# Altium footprint library lib_datalogger.PcbLib: 866 footprints (part 28 of 55)
Each footprint in its own frame and in the unit in brackets; x right, y up, seen from the top. Pads: shape width x height; smd on the part's side, far side on the other; paste and mask are expansions set on the pad; w line width, h text height; cw(c..) or ccw(c..) is an arc to the next point about the centre after c.
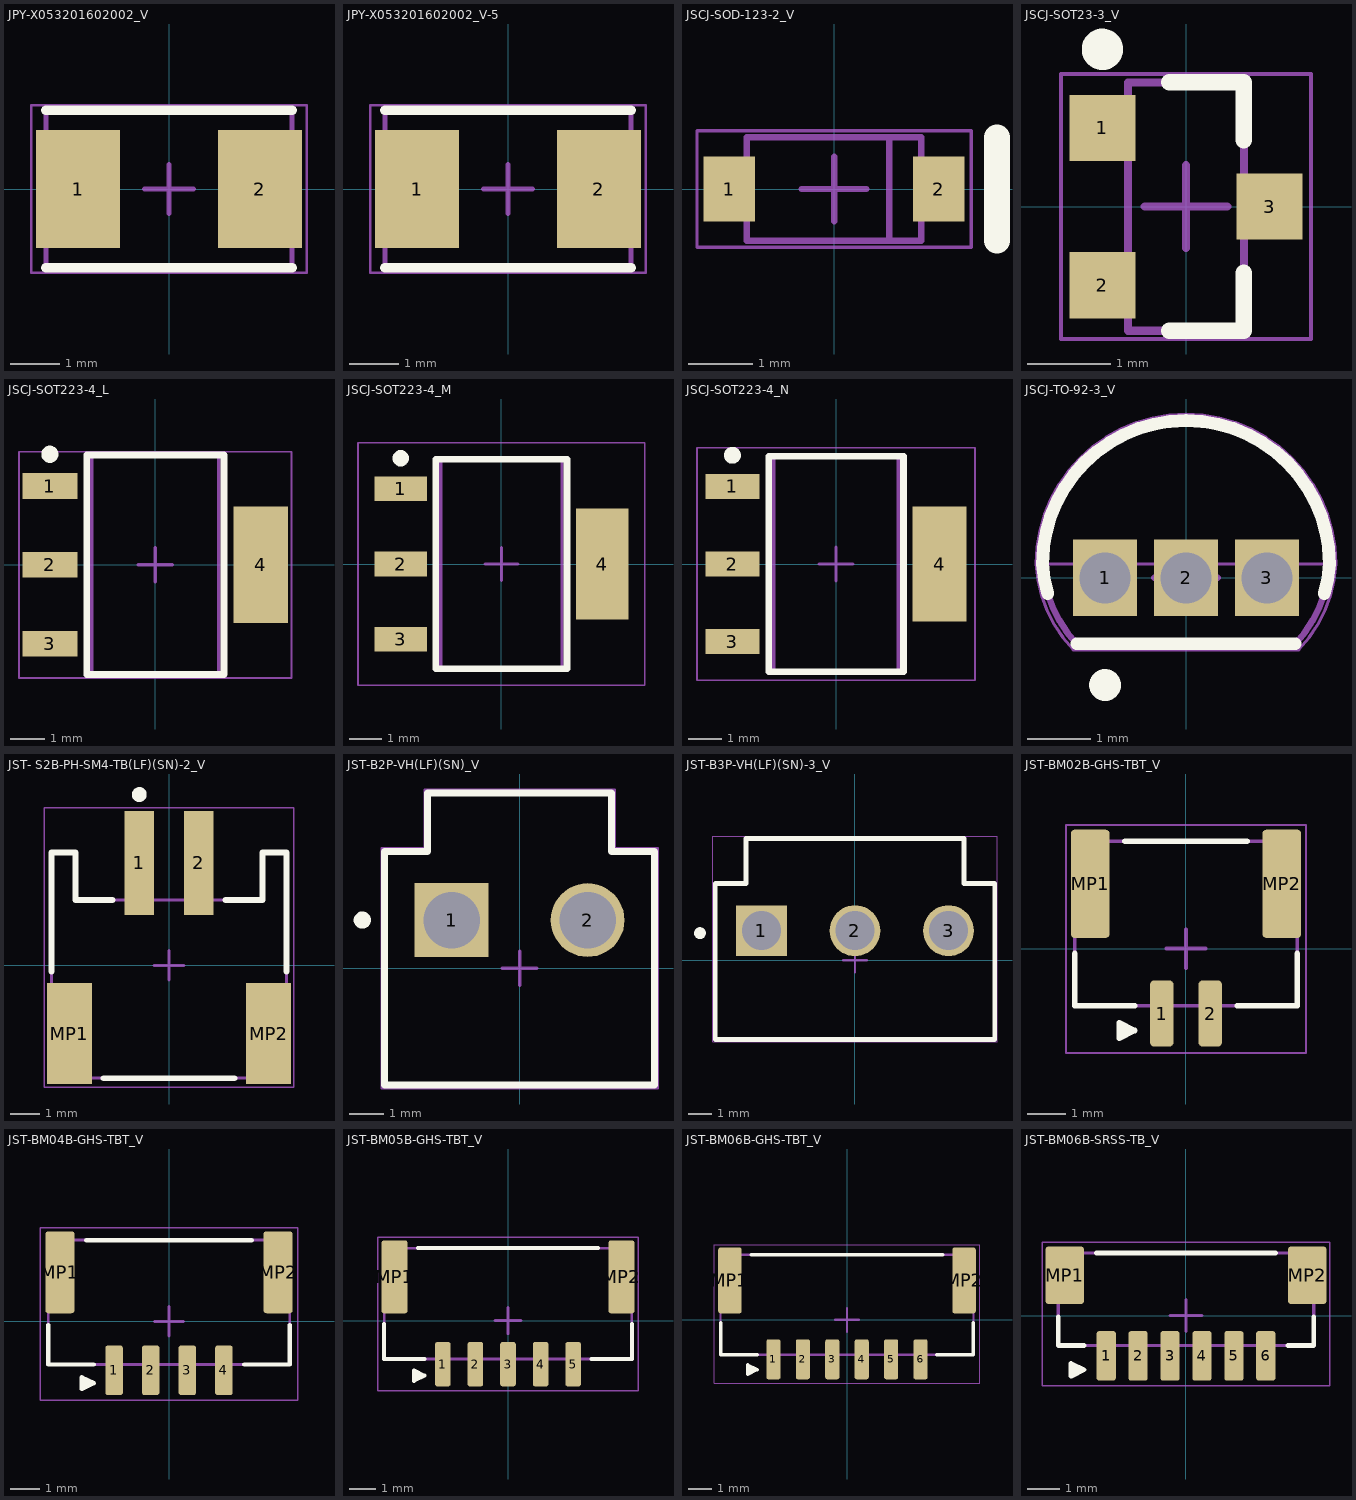
[diagram p27: the footprints below, top view; thin cyan lines are the x and y axes]

## JPY-X053201602002_V [mm] "SMD, 2-Leads, Body 5x3.2mm"
height 1.35
pads (2):
  rect 1.7x2.4 smd: 1(-1.85,0) 2(1.85,0)
Top Overlay:
  lines w0.2: -2.5,-1.6 2.5,-1.6 ; -2.5,1.6 2.5,1.6
Mechanical 13:
  lines w0.1: -2.5,-1.6 2.5,-1.6 2.5,1.6 -2.5,1.6 -2.5,-1.6
Mechanical 15:
  lines w0.05: -2.8,-1.7 2.8,-1.7 2.8,1.7 -2.8,1.7 -2.8,-1.7
  lines w0.1: -0.5,0 0.5,0 ; 0,-0.5 0,0.5
3D body: height 1.35, standoff 0, extent -2.5,-1.6 2.5,1.6

## JPY-X053201602002_V-5 [mm] "SMD, 2-Leads, Body 5x3.2mm"
height 1.35
pads (2):
  rect 1.7x2.4 smd: 1(-1.85,0) 2(1.85,0)
Top Overlay:
  lines w0.2: -2.5,-1.6 2.5,-1.6 ; -2.5,1.6 2.5,1.6
Mechanical 13:
  lines w0.1: -2.5,-1.6 2.5,-1.6 2.5,1.6 -2.5,1.6 -2.5,-1.6
Mechanical 15:
  lines w0.05: -2.8,-1.7 2.8,-1.7 2.8,1.7 -2.8,1.7 -2.8,-1.7
  lines w0.1: -0.5,0 0.5,0 ; 0,-0.5 0,0.5
3D body: height 1.35, standoff 0, extent -2.5,-1.6 2.5,1.6

## JSCJ-SOD-123-2_V [mm] "SOD, 2-Leads, Body 2.7x1.6mm"
height 1.25
pads (2):
  rect 0.8x1 smd: 1(-1.62,0) 2(1.62,0)
Top Overlay:
  lines w0.4: 2.52,-0.8 2.52,0.8
Mechanical 13:
  lines w0.1: 0.85,-0.8 0.85,0.8 ; -1.35,-0.8 1.35,-0.8 1.35,0.8 -1.35,0.8 -1.35,-0.8
Mechanical 15:
  lines w0.05: -2.12,-0.9 2.12,-0.9 2.12,0.9 -2.12,0.9 -2.12,-0.9
  lines w0.1: -0.5,0 0.5,0 ; 0,-0.5 0,0.5
3D body "TSSOP0P370X125-2L.step": height 1.25, standoff 0, extent -1.85,-0.85 1.85,0.85

## JSCJ-SOT23-3_V [mm] "SOT23, 3-Leads, Body 3x1.4mm, Pitch 0.95mm"
height 1.15
pads (3):
  rect 0.8x0.8 smd: 1(-1.01,0.95) 2(-1.01,-0.95) 3(1.01,0)
Top Overlay:
  circle w0.25: c-1.01,1.9 r0.125
  lines w0.2: -0.2,-1.5 0.7,-1.5 0.7,-0.8 ; -0.2,1.5 0.7,1.5 0.7,0.8
Mechanical 13:
  lines w0.1: -0.7,-1.5 0.7,-1.5 0.7,1.5 -0.7,1.5 -0.7,-1.5
Mechanical 15:
  lines w0.05: -1.51,-1.6 1.51,-1.6 1.51,1.6 -1.51,1.6 -1.51,-1.6
  lines w0.1: -0.5,0 0.5,0 ; 0,-0.5 0,0.5
3D body "SOT95P240X115-3L.step": height 1.15, standoff 0, extent -1.275,-1.5 1.275,1.5

## JSCJ-SOT223-4_L [mm] "SOT223, 4-Leads, Body 6.4x3.7mm, Pitch 2.3mm, IPC High Density"
height 1.8
pads (4):
  rect 1.6x0.75 smd: 1(-3.075,2.3) 2(-3.075,0) 3(-3.075,-2.3)
  rect 1.6x3.4 smd: 4(3.075,0)
Top Overlay:
  circle w0.25: c-3.075,3.225 r0.125
  lines w0.2: -2,-3.2 -2,3.2 2,3.2 2,-3.2 -2,-3.2
Mechanical 13:
  lines w0.1: -1.85,-3.2 -1.85,3.2 1.85,3.2 1.85,-3.2 -1.85,-3.2
Mechanical 15:
  lines w0.05: -3.975,-3.3 -3.975,3.3 3.975,3.3 3.975,-3.3 -3.975,-3.3
  lines w0.1: -0.5,0 0.5,0 ; 0,-0.5 0,0.5
3D body "SOT230P695X180-4L.step": height 1.8, standoff 0, extent -3.475,-3.2 3.475,3.2

## JSCJ-SOT223-4_M [mm] "SOT223, 4-Leads, Body 6.4x3.7mm, Pitch 2.3mm, IPC Low Density"
height 1.8
pads (4):
  rect 1.6x0.75 smd: 1(-3.075,2.3) 2(-3.075,0) 3(-3.075,-2.3)
  rect 1.6x3.4 smd: 4(3.075,0)
Top Overlay:
  circle w0.25: c-3.075,3.225 r0.125
  lines w0.2: -2,-3.2 2,-3.2 2,3.2 -2,3.2 -2,-3.2
Mechanical 13:
  lines w0.1: -1.85,-3.2 1.85,-3.2 1.85,3.2 -1.85,3.2 -1.85,-3.2
Mechanical 15:
  lines w0.05: -4.375,-3.7 4.375,-3.7 4.375,3.7 -4.375,3.7 -4.375,-3.7
  lines w0.1: -0.5,0 0.5,0 ; 0,-0.5 0,0.5
3D body "SOT230P695X180-4M.step": height 1.8, standoff 0, extent -3.475,-3.2 3.475,3.2

## JSCJ-SOT223-4_N [mm] "SOT223, 4-Leads, Body 6.4x3.7mm, Pitch 2.3mm, IPC Medium Density"
height 1.8
pads (4):
  rect 1.6x0.75 smd: 1(-3.075,2.3) 2(-3.075,0) 3(-3.075,-2.3)
  rect 1.6x3.4 smd: 4(3.075,0)
Top Overlay:
  circle w0.25: c-3.075,3.225 r0.125
  lines w0.2: -2,-3.2 -2,3.2 2,3.2 2,-3.2 -2,-3.2
Mechanical 13:
  lines w0.1: -1.85,-3.2 -1.85,3.2 1.85,3.2 1.85,-3.2 -1.85,-3.2
Mechanical 15:
  lines w0.05: -4.125,-3.45 -4.125,3.45 4.125,3.45 4.125,-3.45 -4.125,-3.45
  lines w0.1: -0.5,0 0.5,0 ; 0,-0.5 0,0.5
3D body "SOT230P695X180-4N.step": height 1.8, standoff 0, extent -3.475,-3.2 3.475,3.2

## JSCJ-TO-92-3_V [mm] "TO-92, 3-leads, Height 4.7mm, Pitch 1.27mm"
height 4.7
pads (3):
  rect 1x1.2 hole 0.8: 1(-1.27,0) 2(0,0) 3(1.27,0)
Top Overlay:
  circle w0.25: c-1.27,-1.682 r0.125
  lines w0.2: -2.17,-0.248 cw(c-0.294,0.315) -2.25,0.218 cw(c0,0.218) 0,2.468 cw(c0,0.218) 2.25,0.218 cw(c0.294,0.315) 2.17,-0.248 ; -1.715,-1.032 1.715,-1.032
Mechanical 13:
  lines w0.05: -2.25,0.218 2.25,0.218 ; -0.232,-0.218 -0.232,0.218 ; -0.218,-0.218 0.218,-0.218 ; 0.232,-0.218 0.232,0.218
  lines w0.1: -2.25,0.217 ccw(c-0.294,0.315) -1.715,-1.033 1.715,-1.033 ccw(c0.294,0.315) 2.25,0.217 ccw(c0,0.217) 0,2.467 ccw(c0,0.217) -2.25,0.217
Mechanical 15:
  lines w0.05: -2.35,0.212 ccw(c-0.294,0.315) -1.768,-1.122 ; -2.35,0.217 cw(c0,0.217) 0,2.567 cw(c0,0.217) 2.35,0.217 ; -1.768,-1.132 1.767,-1.133 ; 1.767,-1.123 ccw(c0.294,0.315) 2.35,0.212
  lines w0.1: -0.5,0 0.5,0 ; 0,-0.5 0,0.5
3D body: height 4.7, standoff 0, extent -2.249,-1.032 2.249,0.217
3D body: height 4.7, standoff 0, extent -2.251,0.217 2.251,2.468
3D body: height 0, standoff -14.3, extent -0.232,-0.218 0.232,0.218
3D body: height 0, standoff -14.3, extent -1.503,-0.218 -1.038,0.217
3D body: height 0, standoff -14.3, extent 1.037,-0.218 1.502,0.217

## JST- S2B-PH-SM4-TB(LF)(SN)-2_V [mm] "SMD, 2-Leads, Body 7.9x7.6mm, Pitch 2mm"
height 5.5
pads (4):
  rect 1x3.5 smd: 1(-1,3.45) 2(1,3.45)
  rect 1.5x3.4 smd: MP1(-3.35,-2.3) MP2(3.35,-2.3)
Top Overlay:
  circle w0.25: c-1,5.75 r0.125
  lines w0.2: -3.95,-0.2 -3.95,3.8 -3.15,3.8 -3.15,2.2 -1.9,2.2 ; -2.2,-3.8 2.2,-3.8 ; 1.9,2.2 3.15,2.2 3.15,3.8 3.95,3.8 3.95,-0.2
Mechanical 13:
  lines w0.1: -3.95,-3 -3.95,3.8 -3.15,3.8 -3.15,2.2 3.15,2.2 3.15,3.8 3.95,3.8 3.95,-3 3.45,-3 3.45,-3.8 -3.45,-3.8 -3.45,-3 -3.95,-3
Mechanical 15:
  lines w0.05: -4.2,-4.1 4.2,-4.1 4.2,5.3 -4.2,5.3 -4.2,-4.1
  lines w0.1: -0.5,0 0.5,0 ; 0,-0.5 0,0.5
3D body "S2B-PH-SM4-TB.STEP": height 5.6, standoff 0, extent -3.95,-3.8 3.95,4.8

## JST-B2P-VH(LF)(SN)_V [mm] "THD, 2-Leads, Body 8.5x7.86mm, Pitch 3.96mm"
height 10.9
pads (2):
  rect 2.15x2.15 hole 1.65: 1(-1.98,1.4)
  round 2.15 hole 1.65: 2(1.98,1.4)
Top Overlay:
  circle w0.25: c-4.58,1.4 r0.125
  lines w0.2: -3.93,-3.4 -3.93,3.4 -2.68,3.4 -2.68,5.1 2.68,5.1 2.68,3.4 3.93,3.4 3.93,-3.4 -3.93,-3.4
Mechanical 13:
  lines w0.1: -3.93,-3.4 -3.93,3.4 -2.68,3.4 -2.68,5.1 2.68,5.1 2.68,3.4 3.93,3.4 3.93,-3.4 -3.93,-3.4
Mechanical 15:
  lines w0.05: -4.03,-3.5 4.03,-3.5 4.03,3.5 2.78,3.5 2.78,5.2 -2.78,5.2 -2.78,3.5 -4.03,3.5 -4.03,-3.5
  lines w0.1: -0.5,0 0.5,0 ; 0,-0.5 0,0.5
3D body "User Library-B2P-VH.STEP": height 10.9, standoff -3.7, extent -3.93,-3.2 3.93,5.3

## JST-B3P-VH(LF)(SN)-3_V [mm] "Connector, 3-Leads, Body 8.5x11.82mm, Pitch 3.96mm"
height 10.9
pads (3):
  rect 2.15x2.15 hole 1.65: 1(-3.96,1.25)
  round 2.15 hole 1.65: 2(0,1.25) 3(3.96,1.25)
Top Overlay:
  circle w0.25: c-6.56,1.15 r0.125
  lines w0.2: -5.91,-3.35 -5.91,3.25 -4.61,3.25 -4.61,5.15 4.61,5.15 4.61,3.25 5.91,3.25 5.91,-3.35 -5.91,-3.35
Mechanical 13:
  lines w0.1: -5.91,-3.35 5.91,-3.35 5.91,3.25 4.61,3.25 4.61,5.15 -4.61,5.15 -4.61,3.25 -5.91,3.25 -5.91,-3.35
Mechanical 15:
  lines w0.05: -6.01,-3.45 -6.01,5.25 6.01,5.25 6.01,-3.45 -6.01,-3.45
  lines w0.1: -0.5,0 0.5,0 ; 0,-0.5 0,0.5
3D body "User Library-B3P-VH.STEP": height 10.9, standoff -3.7, extent -5.91,-3.35 5.91,5.15

## JST-BM02B-GHS-TBT_V [mm] "Connector, 2-Leads, Body 5.75x4.25mm, Pitch 1.25mm"
height 4.05
pads (4):
  rrect30% 0.6x1.7 smd: 1(-0.625,-1.675) 2(0.625,-1.675)
  rrect20% 1x2.8 smd: MP1(-2.475,1.675) MP2(2.475,1.675)
Top Overlay:
  region: -1.725,-2.313 -1.725,-1.913 -1.325,-2.113
  lines w0.15: -2.875,-0.125 -2.875,-1.475 -1.325,-1.475 ; -1.575,2.775 1.575,2.775 ; 1.325,-1.475 2.875,-1.475 2.875,-0.125 ; -1.725,-2.313 -1.325,-2.113 -1.725,-1.913 -1.725,-2.313
Mechanical 13:
  lines w0.1: -2.875,-1.475 -2.875,2.775 2.875,2.775 2.875,-1.475 -2.875,-1.475
Mechanical 15:
  lines w0.05: -3.1,-2.7 3.1,-2.7 3.1,3.2 -3.1,3.2 -3.1,-2.7
  lines w0.1: -0.5,0 0.5,0 ; 0,-0.5 0,0.5
Top Designator:
  text ".Designator" at -1.397,0.381 h0.6
3D body "BM02B-GHS-TBT.STEP": height 4.21, standoff 0.01, extent -2.875,-2.175 2.875,2.775

## JST-BM04B-GHS-TBT_V [mm] "Connector, 4-Leads, Body 8.25x4.25mm, Pitch 1.25mm"
height 4.05
pads (6):
  rrect30% 0.6x1.7 smd: 1(-1.875,-1.675) 2(-0.625,-1.675) 3(0.625,-1.675) 4(1.875,-1.675)
  rrect20% 1x2.8 smd: MP1(-3.725,1.675) MP2(3.725,1.675)
Top Overlay:
  region: -2.975,-2.313 -2.975,-1.913 -2.575,-2.113
  lines w0.15: -4.125,-0.125 -4.125,-1.475 -2.575,-1.475 ; -2.825,2.775 2.825,2.775 ; 2.575,-1.475 4.125,-1.475 4.125,-0.125 ; -2.975,-2.313 -2.575,-2.113 -2.975,-1.913 -2.975,-2.313
Mechanical 13:
  lines w0.1: -4.125,-1.475 -4.125,2.775 4.125,2.775 4.125,-1.475 -4.125,-1.475
Mechanical 15:
  lines w0.05: -4.4,-2.7 -4.4,3.2 4.4,3.2 4.4,-2.7 -4.4,-2.7
  lines w0.1: -0.5,0 0.5,0 ; 0,-0.5 0,0.5
Top Designator:
  text ".Designator" at -1.27,0.889 h0.6
3D body "BM04B-GHS-TBT.STEP": height 4.21, standoff 0.01, extent -4.125,-2.175 4.125,2.775

## JST-BM05B-GHS-TBT_V [mm] "Connector, 5-Leads, Body 9.5x4.25mm, Pitch 1.25mm"
height 4.05
pads (7):
  rrect30% 0.6x1.7 smd: 1(-2.5,-1.675) 2(-1.25,-1.675) 3(0,-1.675) 4(1.25,-1.675) 5(2.5,-1.675)
  rrect20% 1x2.8 smd: MP1(-4.35,1.675) MP2(4.35,1.675)
Top Overlay:
  region: -3.6,-2.313 -3.6,-1.913 -3.2,-2.113
  lines w0.15: -4.75,-0.125 -4.75,-1.475 -3.2,-1.475 ; -3.45,2.775 3.45,2.775 ; 3.2,-1.475 4.75,-1.475 4.75,-0.125 ; -3.6,-2.313 -3.2,-2.113 -3.6,-1.913 -3.6,-2.313
Mechanical 13:
  lines w0.1: -4.75,-1.475 4.75,-1.475 4.75,2.775 -4.75,2.775 -4.75,-1.475
Mechanical 15:
  lines w0.05: -5,-2.7 -5,3.2 5,3.2 5,-2.7 -5,-2.7
  lines w0.1: -0.5,0 0.5,0 ; 0,-0.5 0,0.5
Top Designator:
  text ".Designator" at -1.397,0.889 h0.6
3D body "BM05B-GHS-TBT.STEP": height 4.2, standoff 0, extent -4.75,-2.175 4.75,2.775

## JST-BM06B-GHS-TBT_V [mm] "Connector, 6-Leads, Body 10.75x4.25mm, Pitch 1.25mm"
height 4.05
pads (8):
  rrect30% 0.6x1.7 smd: 1(-3.125,-1.675) 2(-1.875,-1.675) 3(-0.625,-1.675) 4(0.625,-1.675) 5(1.875,-1.675) 6(3.125,-1.675)
  rrect20% 1x2.8 smd: MP1(-4.975,1.675) MP2(4.975,1.675)
Top Overlay:
  region: -4.225,-2.313 -4.225,-1.913 -3.825,-2.113
  lines w0.15: -5.375,-0.125 -5.375,-1.475 -3.825,-1.475 ; -4.075,2.775 4.075,2.775 ; 3.825,-1.475 5.375,-1.475 5.375,-0.125 ; -4.225,-2.313 -4.225,-1.913 -3.825,-2.113 -4.225,-2.313
Top Courtyard:
  lines w0.05: -5.65,-2.7 -5.65,3.2 5.65,3.2 5.65,-2.7 -5.65,-2.7
  lines w0.1: -0.5,0 0.5,0 ; 0,-0.5 0,0.5
Top Assembly:
  lines w0.1: -5.375,-1.475 -5.375,2.775 5.375,2.775 5.375,-1.475 -5.375,-1.475
Top Designator:
  text ".Designator" at -1.27,0.508 h0.6
3D body "BM06B-GHS-TBT.STEP": height 4.2, standoff 0, extent -5.375,-2.175 5.375,2.775

## JST-BM06B-SRSS-TB_V [mm] "SMD, 6-Leads, Body 2.9x8mm, Pitch 1mm"
height 4.25
pads (8):
  rrect25% 0.6x1.55 smd: 1(-2.5,-1.262) 2(-1.5,-1.262) 3(-0.5,-1.262) 4(0.5,-1.262) 5(1.5,-1.262) 6(2.5,-1.262)
  rrect15% 1.2x1.8 smd: MP1(-3.8,1.263) MP2(3.8,1.263)
Top Overlay:
  region: -3.6,-1.9 -3.6,-1.5 -3.2,-1.7
  lines w0.15: -4,-0.037 -4,-0.937 -3.2,-0.937 ; -2.8,1.963 2.8,1.963 ; 3.2,-0.937 4,-0.937 4,-0.037 ; -3.6,-1.9 -3.2,-1.7 -3.6,-1.5 -3.6,-1.9
Mechanical 13:
  lines w0.1: -4,-0.937 4,-0.937 4,1.963 -4,1.963 -4,-0.937
Mechanical 15:
  lines w0.05: -4.5,-2.2 -4.5,2.3 4.5,2.3 4.5,-2.2 -4.5,-2.2
  lines w0.1: -0.5,0 0.5,0 ; 0,-0.5 0,0.5
Top Designator:
  text ".Designator" at -1.27,0.508 h0.6
3D body "BM06B-SRSS-TB.STEP": height 4.32, standoff 0, extent -4,-1.638 4,1.962